# Altium footprint library Vowstar_Basic_Device.PcbLib: 170 footprints (part 3 of 11)
Each footprint in its own frame and in the unit in brackets; x right, y up, seen from the top. Pads: shape width x height; smd on the part's side, far side on the other; paste and mask are expansions set on the pad; w line width, h text height; cw(c..) or ccw(c..) is an arc to the next point about the centre after c.
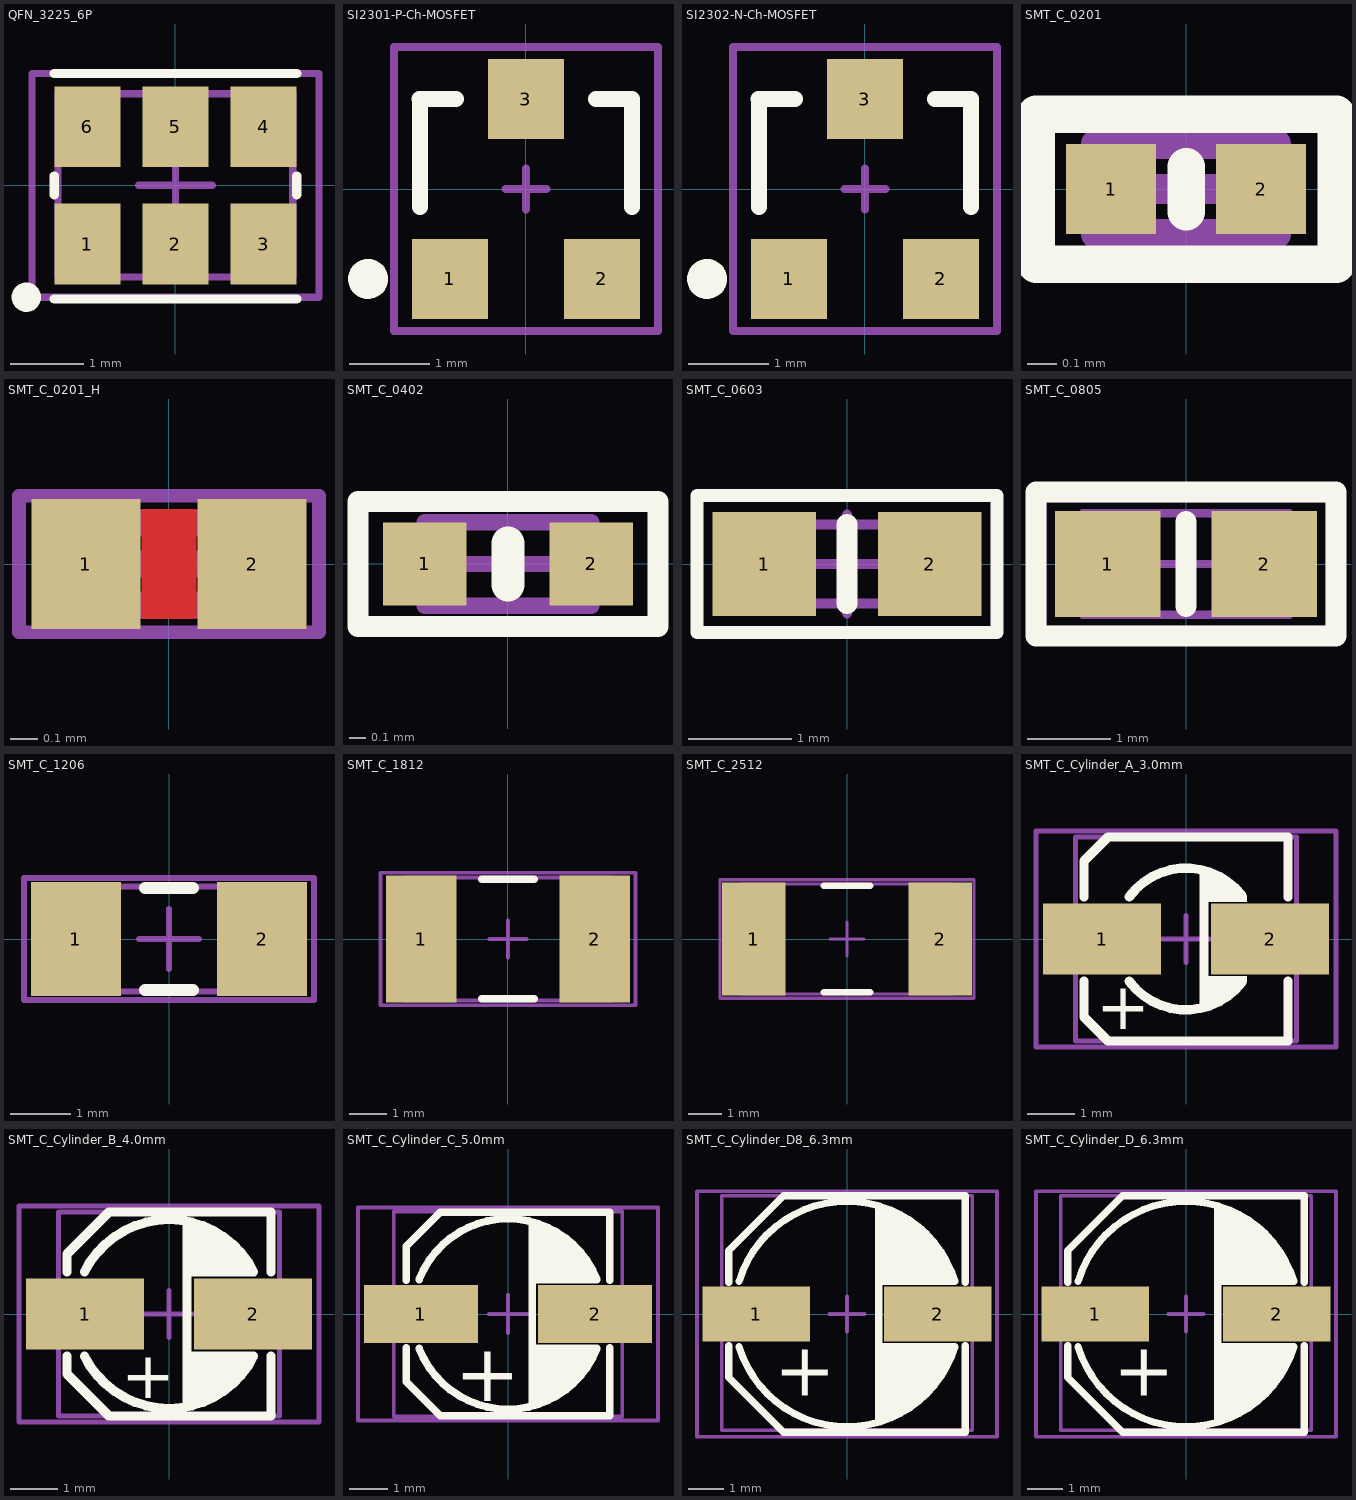
[diagram p2: the footprints below, top view; thin cyan lines are the x and y axes]

## QFN_3225_6P [mm] "SMT; Body 3.2 x 2.5 mm, Differential oscillator"
height 0.75
pads (6):
  rect 0.9x1.1 smd: 1(-1.2,-0.8) 2(0,-0.8) 3(1.2,-0.8) 4(1.2,0.8) 5(0,0.8) 6(-1.2,0.8)
Top Overlay:
  circle w0.2: c-2.032,-1.524 r0.1
  lines w0.127: -1.651,-1.549 1.651,-1.549 ; -1.651,-0.127 -1.651,0.127 ; -1.651,1.524 1.651,1.524 ; 1.651,-0.127 1.651,0.127
Mechanical 13:
  lines w0.1: -1.6,-1.25 -1.6,1.25 1.6,1.25 1.6,-1.25 -1.6,-1.25
Mechanical 15:
  lines w0.1: -0.5,0 0.5,0 ; 0,-0.5 0,0.5 ; -1.956,-1.524 1.956,-1.524 1.956,1.524 -1.956,1.524 -1.956,-1.524
3D body "QFN_3225_6pins.stp": height 0, standoff -0.85, extent -1.6,-1.251 1.6,1.251

## SI2301-P-Ch-MOSFET [mm] "SI2301-P-Ch-MOSFET"
height 0.9
pads (3):
  rect 0.95x1 smd: 1(-0.95,-1.125) 2(0.95,-1.125) 3(0,1.125)
Top Overlay:
  circle w0.25: c-1.975,-1.125 r0.125
  lines w0.2: -1.328,1.125 -0.875,1.125 ; -1.325,-0.225 -1.325,1.125 ; 0.875,1.125 1.325,1.125 1.325,-0.225
Mechanical 15:
  lines w0.1: -0.254,0 0.254,0 ; 0,-0.254 0,0.254 ; -1.651,-1.778 1.651,-1.778 1.651,1.778 -1.651,1.778 -1.651,-1.778
3D body "User Library-SOT23-3.step": height 1.3, standoff 0, extent -1.448,-1.397 1.452,1.403

## SI2302-N-Ch-MOSFET [mm] "SI2302-N-Ch-MOSFET"
height 0.9
pads (3):
  rect 0.95x1 smd: 1(-0.95,-1.125) 2(0.95,-1.125) 3(0,1.125)
Top Overlay:
  circle w0.25: c-1.975,-1.125 r0.125
  lines w0.2: -1.328,1.125 -0.875,1.125 ; -1.325,-0.225 -1.325,1.125 ; 0.875,1.125 1.325,1.125 1.325,-0.225
Mechanical 15:
  lines w0.1: -0.254,0 0.254,0 ; 0,-0.254 0,0.254 ; -1.651,-1.778 1.651,-1.778 1.651,1.778 -1.651,1.778 -1.651,-1.778
3D body "User Library-SOT23-3.step": height 1.3, standoff 0, extent -1.448,-1.397 1.452,1.403

## SMT_C_0201 [mil] "Surface mount capacitor 0201"
height 11.81
pads (2):
  rect 12x12 smd: 1(-10,0) 2(10,0)
Top Overlay:
  lines w5: 0,-3 0,3 ; -20,-10 20,-10 20,10 -20,10 -20,-10
Mechanical 13:
  lines w3.94: -12,-6 12,-6 12,6 -12,6 -12,-6
Mechanical 15:
  lines w3.94: -5,0 5,0 ; 0,-5 0,5 ; -20,-10 -20,10 20,10 20,-10 -20,-10
3D body "User Library-0201(0603M) Cap.step": height 12.1, standoff 0, extent -11.99,-5.99 12.01,6.01

## SMT_C_0201_H [mm] "Chip Capacitor, 2-Leads, Body 0.60x0.30mm, IPC High Density"
height 0.3
pads (2):
  rect 0.4x0.475 smd paste-1 mask-1: 1(-0.305,0) 2(0.305,0)
Top Layer:
  pour cut-out: -0.1,0.2 -0.1,-0.2 0.1,-0.2 0.1,0.2
Top Paste:
  rectangle: -0.43,-0.162 -0.105,0.162
  region: 0.43,0.162 0.105,0.162 0.105,-0.162 0.43,-0.162
Top Solder:
  rectangle: -0.43,-0.162 0.43,0.162
Mechanical 13:
  lines w0.1: -0.3,-0.15 -0.3,0.15 0.3,0.15 0.3,-0.15 -0.3,-0.15
Mechanical 15:
  lines w0.05: -0.55,-0.25 -0.55,0.25 0.55,0.25 0.55,-0.25 -0.55,-0.25
  lines w0.1: -0.15,0 0.15,0 ; 0,-0.15 0,0.15
3D body "User Library-0201(0603M) Cap.step": height 0.31, standoff 0, extent -0.305,-0.152 0.305,0.153

## SMT_C_0402 [mil] "Surface mount capacitor 0402"
height 11.81
pads (2):
  rect 20x20 smd: 1(-20,0) 2(20,0)
Top Overlay:
  lines w5: -36,-15 -36,15 36,15 36,-15 -36,-15
  lines w8: 0,-5 0,5
Mechanical 13:
  lines w3.94: -20,-10 -20,10 20,10 20,-10 -20,-10
Mechanical 15:
  lines w3.94: -10,0 10,0 ; 0,-10 0,10 ; -36,-15 -36,15 36,15 36,-15 -36,-15
3D body "User Library-0402(1005M) Cap.step": height 20.1, standoff 0, extent -20,-10 20,10

## SMT_C_0603 [mm] "Surface mount capacitor 0603"
height 0.85
pads (2):
  rect 1x1 smd: 1(-0.8,0) 2(0.8,0)
Top Overlay:
  lines w0.127: -1.448,-0.66 -1.448,0.66 1.448,0.66 1.448,-0.66 -1.448,-0.66
  lines w0.203: 0,-0.381 0,0.381
Mechanical 13:
  lines w0.1: -1.016,-0.381 -1.016,0.381 1.016,0.381 1.016,-0.381 -1.016,-0.381
Mechanical 15:
  lines w0.1: -0.475,0 0.475,0 ; 0,-0.475 0,0.475 ; -1.448,-0.65 -1.448,0.65 1.448,0.65 1.448,-0.65 -1.448,-0.65
3D body "User Library-0603 SMD Capacitor.step": height 0.79, standoff 0, extent -1,-0.394 1,0.394

## SMT_C_0805 [mil] "Surface mount capacitor 0805"
height 70
pads (2):
  rect 50x50 smd: 1(-37,0) 2(37,0)
Top Overlay:
  lines w10: 0,-20 0,20 ; -71,-34 71,-34 71,34 -71,34 -71,-34
Mechanical 13:
  lines w3.94: -49,-24 49,-24 49,24 -49,24 -49,-24
Mechanical 15:
  lines w3.94: -19.68,0 19.69,0 ; 0,-19.69 0,19.68 ; -68,-31 -68,31 68,31 68,-31 -68,-31
3D body "User Library-0805(2012M) Cap.step": height 31.1, standoff 0, extent -49.37,-24.5 49.38,24.5

## SMT_C_1206 [mm] "Surface mount capacitor 1206"
height 0.71
pads (2):
  rect 1.5x1.9 smd: 1(-1.55,0) 2(1.55,0)
Top Overlay:
  lines w0.2: -0.4,-0.85 0.4,-0.85 ; -0.4,0.85 0.4,0.85
Mechanical 13:
  lines w0.1: -1.675,-0.875 -1.675,0.875 1.675,0.875 1.675,-0.875 -1.675,-0.875
Mechanical 15:
  lines w0.1: -0.5,0 0.5,0 ; 0,-0.5 0,0.5 ; -2.413,-1.016 -2.413,1.016 2.413,1.016 2.413,-1.016 -2.413,-1.016
3D body "User Library-1206(3216M) Cap.step": height 1.53, standoff 0, extent -2,-0.8 2,0.8

## SMT_C_1812 [mm] "Surface mount capacitor 1812"
height 1.7
pads (2):
  rect 1.9x3.4 smd: 1(-2.331,0) 2(2.331,0)
Top Overlay:
  lines w0.2: -0.7,-1.6 0.7,-1.6 ; -0.7,1.6 0.7,1.6
Mechanical 13:
  lines w0.1: -2.794,-1.651 -2.794,1.651 2.794,1.651 2.794,-1.651 -2.794,-1.651
Mechanical 15:
  lines w0.1: -0.5,0 0.5,0 ; 0,-0.5 0,0.5 ; -3.429,-1.778 -3.429,1.778 3.429,1.778 3.429,-1.778 -3.429,-1.778
3D body "User Library-1812(4532M) Cap.step": height 2.54, standoff 0, extent -2.81,-1.6 2.81,1.6

## SMT_C_2512 [mm] "Surface mount capacitor 2512"
height 1.7
pads (2):
  rect 1.9x3.4 smd: 1(-2.8,0) 2(2.8,0)
Top Overlay:
  lines w0.2: -0.7,-1.6 0.7,-1.6 ; -0.7,1.6 0.7,1.6
Mechanical 13:
  lines w0.1: -3.175,-1.651 -3.175,1.651 3.175,1.651 3.175,-1.651 -3.175,-1.651
Mechanical 15:
  lines w0.1: -0.5,0 0.5,0 ; 0,-0.5 0,0.5 ; -3.81,-1.778 -3.81,1.778 3.81,1.778 3.81,-1.778 -3.81,-1.778
3D body "User Library-2512(6432M) Cap.step": height 3.21, standoff -0.01, extent -3.464,-1.61 3.464,1.615

## SMT_C_Cylinder_A_3.0mm [mm] "Surface mount cylindrical capacitor type A 3.0mm"
height 5.4
pads (2):
  rect 2.5x1.5 smd: 1(-1.778,0) 2(1.778,0)
Top Overlay:
  region: 0.394,0.787 1.283,0.787 1.283,0.914 1.029,1.168 0.648,1.422 0.394,1.422
  region: 0.394,-0.787 1.283,-0.787 1.283,-0.914 1.029,-1.168 0.648,-1.422 0.394,-1.422
  lines w0.2: -2.159,-0.889 -2.159,-1.651 -1.651,-2.159 2.159,-2.159 2.159,-0.889 ; -2.159,0.889 -2.159,1.651 -1.651,2.159 2.159,2.159 2.159,0.889 ; -1.203,-0.896 ccw(c0,0) 1.184,-0.921 ; -1.203,0.896 cw(c0,0) 1.181,0.924 ; 0.381,-1.397 0.381,1.397
  text "+" at -1.905,-1.905 h1
Mechanical 13:
  lines w0.1: -2.337,-2.159 2.337,-2.159 2.337,2.159 -2.337,2.159 -2.337,-2.159
Mechanical 15:
  lines w0.1: -0.5,0 0.5,0 ; 0,-0.5 0,0.5 ; -3.175,-2.286 3.175,-2.286 3.175,2.286 -3.175,2.286 -3.175,-2.286
3D body "User Library-capacitor size A.step": height 5.71, standoff 0.01, extent -2.35,-2.141 2.35,2.159

## SMT_C_Cylinder_B_4.0mm [mm] "Surface mount cylindrical capacitor type B 4.0mm"
height 5.4
pads (2):
  rect 2.5x1.5 smd: 1(-1.778,0) 2(1.778,0)
Top Overlay:
  region: 0.368,-0.8 1.816,-0.8 1.638,-1.181 1.13,-1.689 0.622,-1.943 0.368,-1.943
  region: 0.381,0.8 1.829,0.8 1.651,1.181 1.143,1.689 0.635,1.943 0.381,1.943
  lines w0.2: -2.159,-0.889 -2.159,-1.27 -1.27,-2.159 2.159,-2.159 2.159,-0.889 ; -2.159,0.889 -2.159,1.27 -1.27,2.159 2.159,2.159 2.159,0.889 ; -1.789,-0.894 ccw(c0,0) 1.789,-0.894 ; -1.789,0.894 cw(c0,0) 1.789,0.894 ; 0.381,-1.905 0.381,1.905
  text "+" at -1.016,-1.778 h1
Mechanical 13:
  lines w0.1: -2.337,-2.159 -2.337,2.159 2.337,2.159 2.337,-2.159 -2.337,-2.159
Mechanical 15:
  lines w0.1: -0.5,0 0.5,0 ; 0,-0.5 0,0.5 ; -3.175,-2.286 3.175,-2.286 3.175,2.286 -3.175,2.286 -3.175,-2.286
3D body "User Library-capacitor size B.step": height 5.41, standoff -0.01, extent -2.3,-2.15 2.3,2.15

## SMT_C_Cylinder_C_5.0mm [mil] "Surface mount cylindrical capacitor type C 5.0mm"
height 212.6
pads (2):
  rect 118.11x60 smd: 1(-90,0) 2(90,0)
Top Overlay:
  region: 25,-32 92,-32 82,-55 62,-78 32,-93 25,-95
  region: 25,32 92,32 82,55 62,78 32,93 25,95
  lines w7.87: -105,-35 -105,-70 -70,-105 105,-105 105,-35 ; -105,35 -105,70 -70,105 105,105 105,35 ; -91.73,-35.67 ccw(c0,0) 91.73,-35.67 ; -91.73,35.67 cw(c0,0) 91.73,35.67 ; 25,-95 25,95
  text "+" at -55,-90 h59.06
Mechanical 13:
  lines w3.94: -118,-106 118,-106 118,106 -118,106 -118,-106
Mechanical 15:
  lines w3.94: -19.69,0 19.68,0 ; 0,-19.68 0,19.69 ; -155,-110 -155,110 155,110 155,-110 -155,-110
3D body "User Library-capacitor size C.step": height 212.8, standoff -0.2, extent -116.14,-104.33 116.14,104.33

## SMT_C_Cylinder_D8_6.3mm [mm] "Surface mount cylindrical capacitor type D8 6.3mm"
height 7.7
pads (2):
  rect 3x1.524 smd: 1(-2.54,0) 2(2.54,0)
Top Overlay:
  region: 3.01,0.813 0.902,0.813 0.902,3.023 1.359,2.87 2.07,2.413 2.553,1.88 3.01,0.94
  region: 3.01,-0.813 0.902,-0.813 0.902,-3.023 1.359,-2.87 2.07,-2.413 2.553,-1.88 3.01,-0.94
  lines w0.2: -3.302,-0.889 -3.302,-1.778 -1.778,-3.302 3.302,-3.302 3.302,-0.889 ; -3.302,0.889 -3.302,1.778 -1.778,3.302 3.302,3.302 3.302,0.889 ; -3.015,-0.912 ccw(c0,0) 3.015,-0.912 ; -3.014,0.917 cw(c0,0) 3.015,0.912 ; 0.889,-2.921 0.889,2.921
  text "+" at -2.032,-2.286 h1.5
Mechanical 13:
  lines w0.1: -3.505,-3.251 -3.505,3.302 3.505,3.302 3.505,-3.251 -3.505,-3.251
Mechanical 15:
  lines w0.1: -0.5,0 0.5,0 ; 0,-0.5 0,0.5 ; -4.191,-3.429 -4.191,3.429 4.191,3.429 4.191,-3.429 -4.191,-3.429
3D body "User Library-capacitor size D8.step": height 7.71, standoff -0.01, extent -3.5,-3.3 3.5,3.3

## SMT_C_Cylinder_D_6.3mm [mm] "Surface mount cylindrical capacitor type D 6.3mm"
height 5.4
pads (2):
  rect 3x1.524 smd: 1(-2.54,0) 2(2.54,0)
Top Overlay:
  region: 3.01,-0.813 0.902,-0.813 0.902,-3.023 1.359,-2.87 2.07,-2.413 2.553,-1.88 3.01,-0.94
  region: 3.01,0.813 0.902,0.813 0.902,3.023 1.359,2.87 2.07,2.413 2.553,1.88 3.01,0.94
  lines w0.2: -3.302,-0.889 -3.302,-1.778 -1.778,-3.302 3.302,-3.302 3.302,-0.889 ; -3.302,0.889 -3.302,1.778 -1.778,3.302 3.302,3.302 3.302,0.889 ; -3.015,-0.912 ccw(c0,0) 3.015,-0.912 ; -3.014,0.917 cw(c0,0) 3.015,0.912 ; 0.889,-2.921 0.889,2.921
  text "+" at -2.032,-2.286 h1.5
Mechanical 13:
  lines w0.1: -3.505,-3.251 -3.505,3.302 3.505,3.302 3.505,-3.251 -3.505,-3.251
Mechanical 15:
  lines w0.1: -0.5,0 0.5,0 ; 0,-0.5 0,0.5 ; -4.191,-3.429 4.191,-3.429 4.191,3.429 -4.191,3.429 -4.191,-3.429
3D body "User Library-capacitor size D.step": height 5.41, standoff -0.01, extent -3.5,-3.3 3.5,3.3